# Altium footprint library Mylib.PcbLib: 294 footprints (part 14 of 19)
Each footprint in its own frame and in the unit in brackets; x right, y up, seen from the top. Pads: shape width x height; smd on the part's side, far side on the other; paste and mask are expansions set on the pad; w line width, h text height; cw(c..) or ccw(c..) is an arc to the next point about the centre after c.
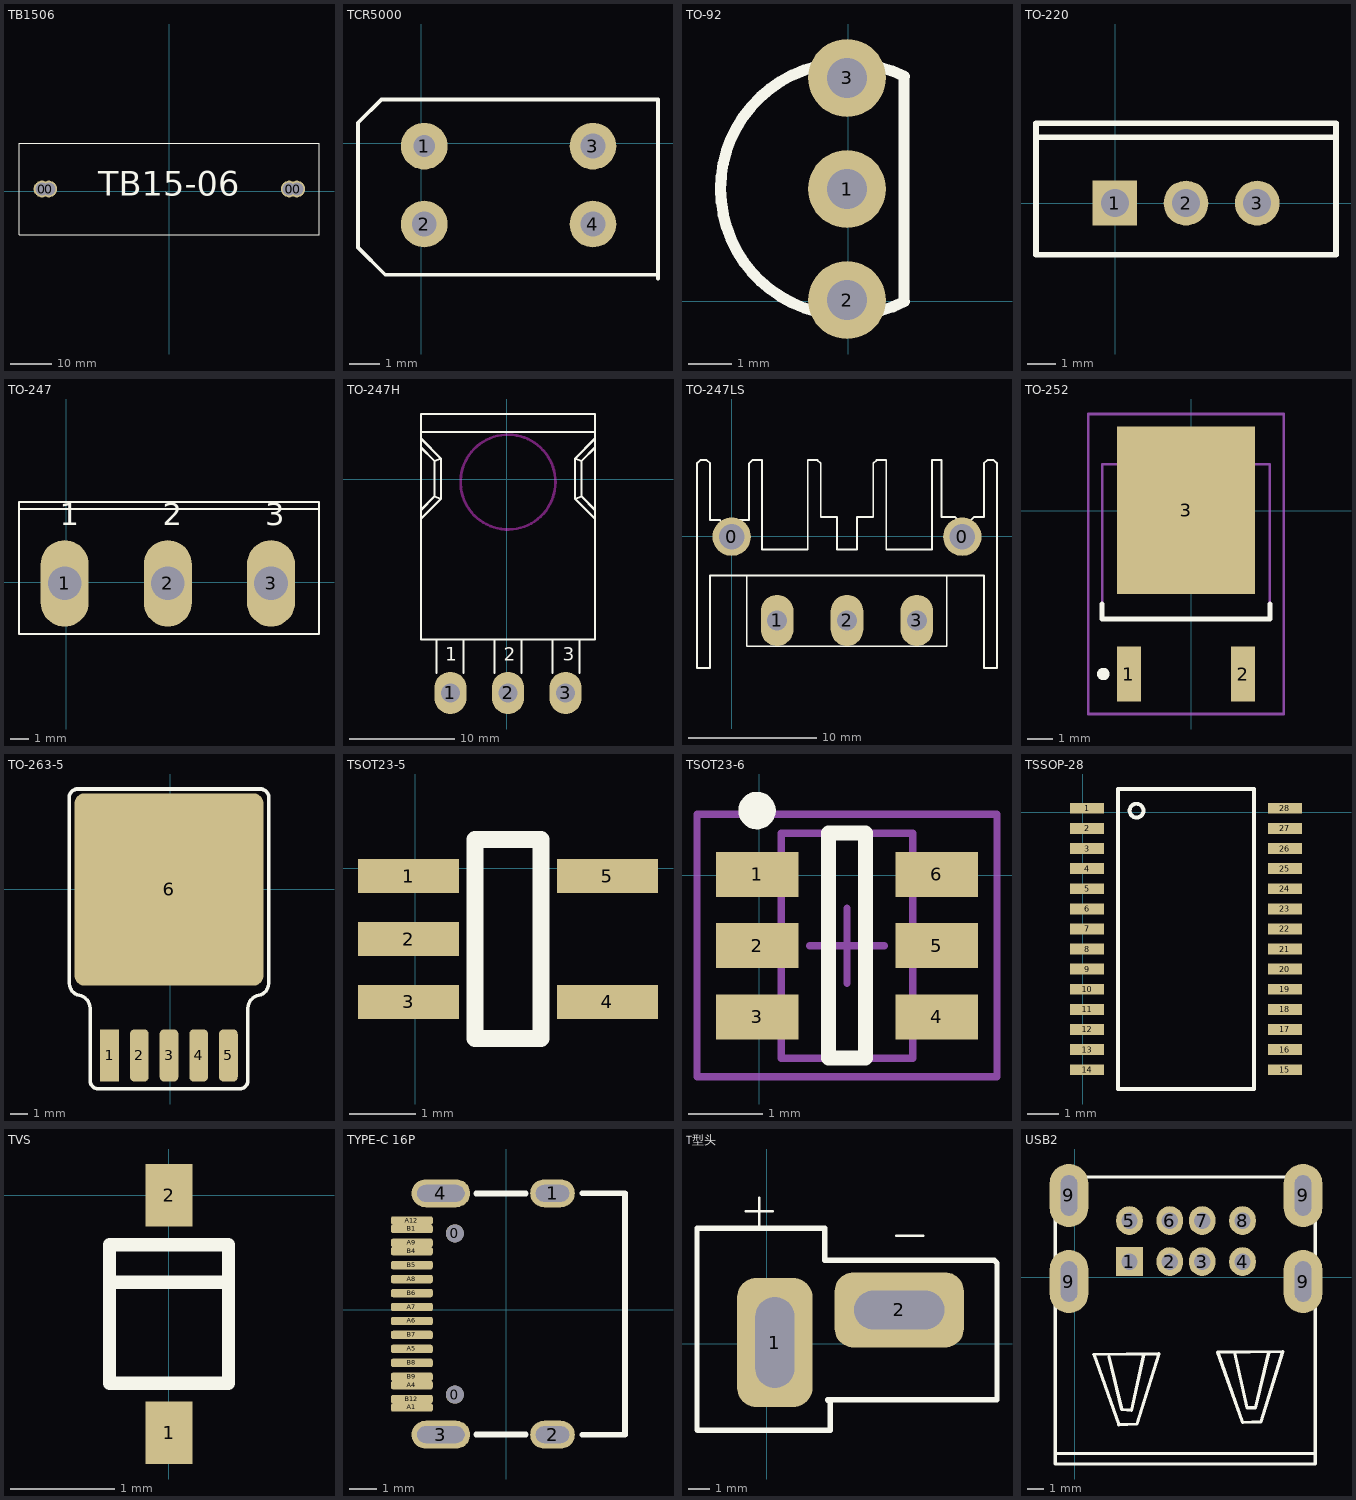
[diagram p13: the footprints below, top view; thin cyan lines are the x and y axes]

## TB1506 [mm]
pads (4):
  round 4 hole 3.1: 0(-30.5,0.5) 0(-28.85,0.5) 0(28.65,0.5) 0(30.5,0.5)
Top Overlay:
  lines w0.1: -36,-10.5 -36,11.5 35.8,11.5 35.8,-10.5 -36,-10.5
  text "TB15-06" at -17,-3 h10
3D body "User Library-Terminal block TB-1506.STEP": height 17, standoff 0, extent -36.6,-10.5 36.4,11.5

## TCR5000 [mil]
pads (4):
  round 60 hole 28 mask+0: 1(3.94,-3.54)
  round 60 hole 32 mask+0: 2(3.94,-103.54) 3(220.47,-3.54) 4(220.47,-103.54)
Top Overlay:
  lines w5: 303.94,-173.54 303.94,56.46 -51.06,56.46 -81.06,26.46 -81.06,-133.54 -46.06,-168.54 303.94,-168.54

## TO-92 [mil]
pads (3):
  round 70 hole 36: 1(-1,101) 2(-1,1) 3(-1,201)
Top Overlay:
  lines w10: 50.18,1 50.18,201.79 ; 50.5,202.42 ccw(c-1,101) 50.82,-0.26
3D body "TO-92(变形好).STEP": height 327.95, standoff -381.89, extent -101,-25 63.6,200.98

## TO-220 [mm]
pads (3):
  rect 1.6x1.6 hole 1: 1(-0.025,0)
  round 1.6 hole 1: 2(2.515,0) 3(5.055,0)
Top Overlay:
  lines w0.2: -2.835,2.35 7.865,2.35 ; -2.835,-1.85 -2.835,2.85 7.865,2.85 7.865,-1.85 -2.835,-1.85
3D body "SW3DPS-TO-220HS-DEFAULT.STEP": height 18.54, standoff -3.81, extent -2.54,-1.651 7.62,2.921

## TO-247 [mil]
pads (3):
  oval 100x180 hole 70: 1(-3,-2) 2(212,-2) 3(427,-2)
Top Overlay:
  lines w3.94: -98,153 527,153 ; -98,-107 -98,168 527,168 527,-107 -98,-107
  text "3" at 415,104 h80
  text "2" at 201,104 h80
  text "1" at -13,104 h80
3D body "User Library-IRFP2907.step": height 984.25, standoff -387.64, extent -93.12,-100.43 517.12,96.43

## TO-247H [mil]
pads (3):
  oval 120x157.48 hole 70: 1(-211,-798) 2(4,-798) 3(219,-798)
Top Overlay:
  lines w7.87: -321,-148 -246,-73 ; -321,-114.67 -271,-64.67 ; -321,118.67 -271,68.67 ; -321,152 -246,77 ; -321,177 329,177 ; -262.67,-723 -262.67,-598 ; -162.67,-723 -162.67,-598 ; -46,-723 -46,-598 ; 54,-723 54,-598 ; 170.67,-723 170.67,-598 ; 270.67,-723 270.67,-598 ; 329,-148 254,-73 ; 329,-114.67 279,-64.67 ; 329,118.67 279,68.67 ; 329,152 254,77 ; -271,-64.67 -246,-73 ; -271,-64.67 -271,68.67 ; -271,68.67 -246,77 ; -246,-73 -246,77 ; 254,-73 279,-64.67 ; 254,-73 254,77 ; 254,77 279,68.67 ; 279,-64.67 279,68.67 ; -321,-598 -321,243.67 329,243.67 329,-598 -321,-598
  text "3" at 209,-678 h50
  text "2" at -11,-678 h50
  text "1" at -231,-678 h50
Keep-Out Layer:
  circle w10: c4,-10.6 r177.16
3D body "User Library-TO-247H.STEP": height 278.74, standoff -189.76, extent -301.23,-807.99 309,192.01

## TO-247LS [mm]
pads (5):
  round 3 hole 2: 0(-0.008,-0.02) 0(17.992,-0.02)
  oval 2.54x4 hole 1.575: 1(3.542,-6.552) 2(8.992,-6.552) 3(14.442,-6.552)
Top Overlay:
  lines w0.1: 1.192,-3.052 1.192,-8.552 16.792,-8.552 16.792,-3.052
  lines w0.15: -0.676,0.176 -0.676,1.012 -0.93,1.266 -1.692,1.266 -1.692,5.694 -1.946,5.948 -2.454,5.948 -2.708,5.694 -2.708,-3.052 -2.708,-3.306 -2.708,-10.252 -1.692,-10.252 -1.692,-3.052 19.676,-3.052 19.676,-10.252 20.692,-10.252 20.692,5.694 20.438,5.948 19.93,5.948 19.676,5.694 19.676,1.52 18.914,1.52 18.66,1.266 18.66,0.237 ; 0.34,0.504 0.34,1.012 0.594,1.266 1.356,1.266 1.356,5.694 1.61,5.948 2.372,5.948 2.372,-1.02 5.928,-1.02 5.928,5.948 6.69,5.948 6.944,5.694 6.944,1.52 8.214,1.52 8.214,-1.02 9.77,-1.02 9.77,1.52 11.04,1.52 11.04,5.694 11.294,5.948 12.056,5.948 12.056,-1.02 15.612,-1.02 15.612,5.948 16.374,5.948 16.374,1.52 17.39,1.52 17.644,1.266 17.644,0.504
3D body "User Library-heat sink-1.step": height 30.62, standoff 0, extent -2.458,-10.327 20.442,6.073
3D body "User Library-M3x8.STEP": height 20.6, standoff 15, extent 6.192,-10.077 11.792,-0.592
3D body "2SK2225.STEP": height 23, standoff -17.9, extent 1.225,-8.539 16.825,-3.039

## TO-252 [mm] "MOS"
pads (3):
  rect 0.95x2.2 smd: 1(-2.483,-6.534) 2(2.077,-6.534)
  rect 5.5x6.7 smd: 3(-0.203,0.016)
Top Overlay:
  circle w0.25: c-3.508,-6.534 r0.125
  lines w0.2: -3.553,-3.734 -3.553,-4.334 3.147,-4.334 3.147,-3.734
Mechanical 13:
  lines w0.1: -3.553,-4.334 -3.553,1.866 3.147,1.866 3.147,-4.334 -3.553,-4.334
Mechanical 15:
  lines w0.1: -0.703,-2.134 0.297,-2.134 ; -0.203,-2.634 -0.203,-1.634 ; -4.103,-8.134 -4.103,3.866 3.697,3.866 3.697,-8.134 -4.103,-8.134
3D body "User Library-DPAK-1.STEP": height 2.39, standoff -0.02, extent -3.473,-7.034 3.067,2.905

## TO-263-5 [mm]
pads (6):
  rect 1.07x3 smd: 1(-3.47,-9.503)
  rrect50% 1.07x3 smd: 2(-1.77,-9.503) 3(-0.07,-9.503) 4(1.63,-9.503) 5(3.33,-9.503)
  rrect10% 10.8x11 smd: 6(-0.07,-0.003)
Top Overlay:
  lines w0.2: -4.582,-10.875 ccw(c-4.097,-10.934) -4.195,-11.412 ; 4.055,-11.412 ccw(c3.958,-10.934) 4.442,-10.875
  lines w0.203: -5.77,5.297 -5.77,-5.283 ccw(c-5.075,-5.368) -5.215,-6.054 cw(c-5.376,-6.838) -4.582,-6.935 -4.582,-10.875 ; -5.77,5.356 cw(c-5.292,5.258) -5.369,5.74 ; -5.37,5.747 5.23,5.747 ; -4.195,-11.412 4.055,-11.412 ; 4.442,-10.875 4.442,-6.935 cw(c5.236,-6.838) 5.076,-6.054 ccw(c4.935,-5.368) 5.63,-5.283 5.63,5.297 ; 5.229,5.74 cw(c5.152,5.258) 5.63,5.356
3D body: height 4.48, standoff 0, extent -5.207,-9.554 5.017,4.797

## TSOT23-5 [mil]
pads (5):
  rect 60x20 smd: 1(-4.06,-4.53) 2(-4.06,-41.93) 3(-4.06,-79.33) 4(114.06,-79.33) 5(114.06,-4.53)
Top Overlay:
  lines w10: 35.31,-100.98 74.69,-100.98 74.69,17.13 35.31,17.13 35.31,-100.98
3D body: height 47.24, standoff 0, extent 1,-98.09 111.23,16.09

## TSOT23-6 [mm]
pads (6):
  rect 1.1x0.6 smd: 1(-0.032,0.01) 2(-0.032,-0.94) 3(-0.032,-1.89) 4(2.368,-1.89) 5(2.368,-0.94) 6(2.368,0.01)
Top Overlay:
  circle w0.25: c-0.032,0.86 r0.125
  lines w0.2: 0.918,-2.44 1.418,-2.44 1.418,0.56 0.918,0.56 0.918,-2.44
Mechanical 13:
  lines w0.1: 0.293,-2.44 0.293,0.56 2.043,0.56 2.043,-2.44 0.293,-2.44
Mechanical 15:
  lines w0.1: 0.668,-0.94 1.668,-0.94 ; 1.168,-1.44 1.168,-0.44 ; -0.832,-2.69 -0.832,0.81 3.168,0.81 3.168,-2.69 -0.832,-2.69
3D body: height 1.45, standoff 0, extent 0.293,-2.44 2.043,0.56

## TSSOP-28 [mm]
pads (28):
  rect 1.1x0.35 smd: 1(0.134,0.126) 2(0.134,-0.524) 3(0.134,-1.174) 4(0.134,-1.824) 5(0.134,-2.474) 6(0.134,-3.124) 7(0.134,-3.774) 8(0.134,-4.424) 9(0.134,-5.074) 10(0.134,-5.724) 11(0.134,-6.374) 12(0.134,-7.024) 13(0.134,-7.674) 14(0.134,-8.324) 15(6.534,-8.324) 16(6.534,-7.674) 17(6.534,-7.024) 18(6.534,-6.374) 19(6.534,-5.724) 20(6.534,-5.074) 21(6.534,-4.424) 22(6.534,-3.774) 23(6.534,-3.124) 24(6.534,-2.474) 25(6.534,-1.824) 26(6.534,-1.174) 27(6.534,-0.524) 28(6.534,0.126)
Top Overlay:
  circle w0.127: c1.734,0.051 r0.224
  lines w0.127: 1.134,-8.949 5.534,-8.949 5.534,0.751 1.134,0.751 1.134,-8.949
3D body "User Library-TSSOP-28_P065.STEP": height 0.92, standoff -0.07, extent 0.15,-8.95 6.55,0.75

## TVS [mm]
pads (2):
  rect 0.45x0.6 smd: 1(0.003,-2.286) 2(0.003,0)
Top Overlay:
  lines w0.127: -0.555,-0.838 0.562,-0.838 ; -0.57,-1.809 0.576,-1.809 0.576,-0.477 -0.57,-0.477 -0.57,-1.809
3D body "SOD-323.STEP": height 1, standoff 0, extent -0.65,-2.45 0.65,0.15

## TYPE-C 16P [mm] "贴片USB-3.1  4固定插脚"
pads (22):
  round 0.65 hole 0.65: 0(-1.834,-3.045) 0(-1.834,2.735)
  oval 1.6x1 hole 0.6 slot 1.2 at 0 deg: 1(1.666,4.17) 2(1.666,-4.48)
  oval 2.1x1 hole 0.6 slot 1.7 at 0 deg: 3(-2.334,-4.48) 4(-2.334,4.17)
  rrect50% 1.5x0.3 smd: A1(-3.374,-3.505) A4(-3.374,-2.705) A5(-3.374,-1.405) A6(-3.374,-0.405) A7(-3.374,0.095) A8(-3.374,1.095) A9(-3.374,2.395) A12(-3.374,3.195) B1(-3.374,2.895) B4(-3.374,2.095) B5(-3.374,1.595) B6(-3.374,0.595) B7(-3.374,-0.905) B8(-3.374,-1.905) B9(-3.374,-2.405) B12(-3.374,-3.205)
Top Overlay:
  lines w0.203: -1.073,-4.473 0.705,-4.473 ; -1.073,4.163 0.705,4.163 ; 2.737,-4.48 4.266,-4.48 4.266,4.17 2.737,4.17
3D body "USB Type-C_A.STEP": height 3.25, standoff -0.85, extent -3.446,-4.648 4.454,4.292

## T型头 [mm]
pads (2):
  rrect50% 3.5x6 hole 1.8 slot 4.2 at 90 deg: 1(0.373,0.053)
  rrect50% 6x3.5 hole 1.8 slot 4.2 at 0 deg: 2(6.157,1.566)
Top Overlay:
  lines w0.1: -0.986,6.154 0.284,6.154 ; -0.351,5.519 -0.351,6.789 ; 5.999,5.011 7.269,5.011
  lines w0.254: -3.243,-4.006 -3.243,5.366 2.697,5.366 2.697,3.868 10.571,3.868 10.698,3.741 10.698,-2.609 2.824,-2.609 2.951,-2.736 2.951,-4.034 -3.215,-4.034 -3.243,-4.006
3D body "User Library-Deans.step": height 14.1, standoff -4.9, extent -2.665,-3.157 9.335,4.143

## USB2 [mil]
pads (12):
  rect 65x70 hole 40: 1(133.11,38.86)
  oval 65x70 hole 40: 2(231.54,38.86) 3(310.28,38.86) 4(408.7,38.86) 5(133.11,138.86) 6(231.54,138.86) 7(310.28,138.86) 8(408.7,138.86)
  oval 94.49x153.54 hole 40 slot 98.43 at 90 deg: 9(-14.53,-9.84) 9(-14.53,200) 9(556.34,-9.84) 9(556.34,200)
Top Overlay:
  lines w7.87: -47.8,-429.05 586.11,-429.05 586.11,-432.74 ; 83.04,-193.18 114.37,-322.17 138.32,-324.01 167.8,-187.65 ; 388.94,-182.12 419.34,-317.57 440.53,-317.57 472.78,-183.04 ; -47.8,-454.85 586.11,-454.85 586.11,245.4 -47.8,245.4 -47.8,-454.85 ; 46.18,-187.65 204.66,-185.81 151.22,-357.18 106.99,-359.03 46.18,-187.65 ; 348.4,-182.12 506.87,-180.28 453.43,-351.66 409.21,-353.5 348.4,-182.12
3D body "USB A2.STEP": height 657.48, standoff -114.17, extent -29.09,-425.43 573.27,243.86